# Altium footprint library capacitor_thd.PcbLib: 131 footprints (part 3 of 9)
Each footprint in its own frame and in the unit in brackets; x right, y up, seen from the top. Pads: shape width x height; smd on the part's side, far side on the other; paste and mask are expansions set on the pad; w line width, h text height; cw(c..) or ccw(c..) is an arc to the next point about the centre after c.
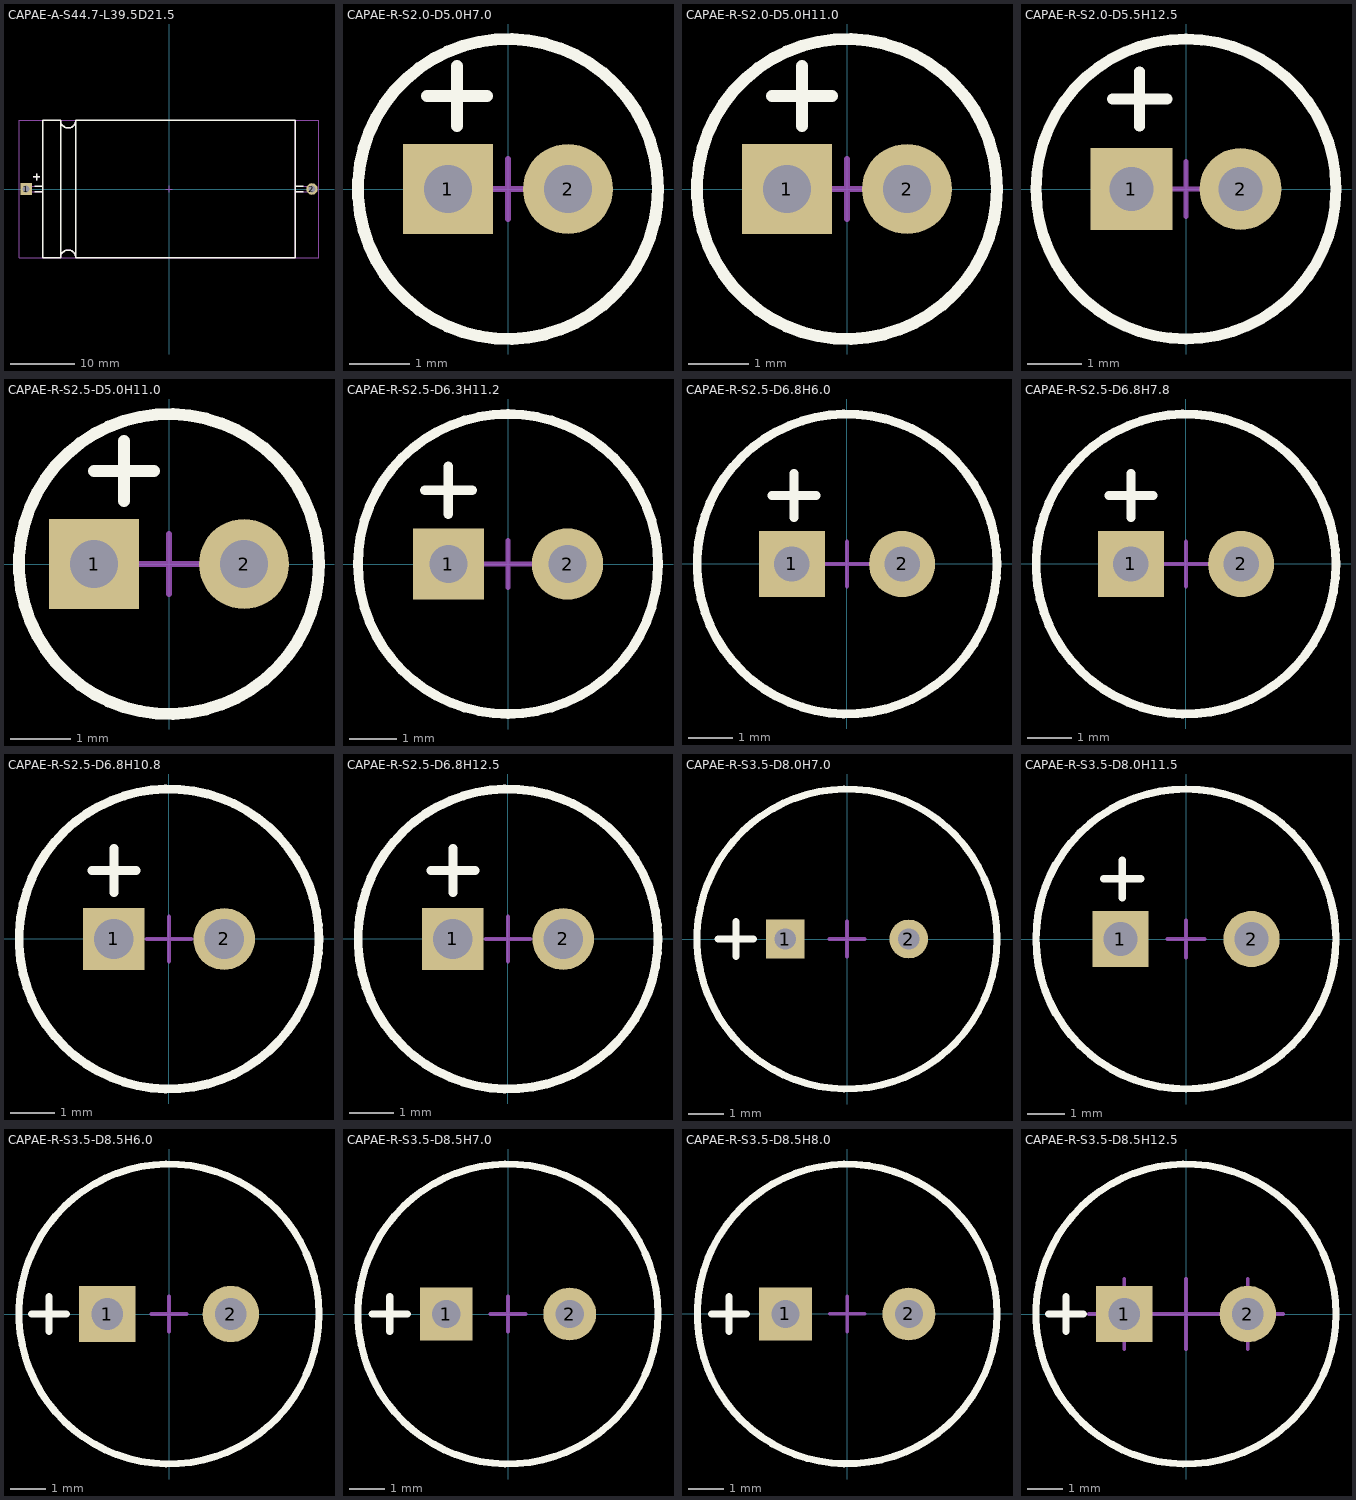
[diagram p2: the footprints below, top view; thin cyan lines are the x and y axes]

## CAPAE-A-S44.7-L39.5D21.5 [mm] "Capacitor Axial, Pin spacing 44.7mm - Body Length 39.5mm X Body Diameter 21.5mm"
height 21.5
pads (2):
  rect 1.8x1.8 hole 1.1: 1(-22.35,0)
  round 1.8 hole 1.1: 2(22.35,0)
Top Overlay:
  lines w0.2: -21.2,1.9 -20.2,1.9 ; -21.008,-0.4 -19.76,-0.4 ; -21.008,0.4 -19.76,0.4 ; -20.7,1.4 -20.7,2.4 ; 19.76,-0.4 21.008,-0.4 ; 19.76,0.4 21.008,0.4 ; -16.96,-10.75 cw(c-15.76,-10.75) -14.56,-10.75 ; -16.96,-10.75 -19.76,-10.75 -19.76,10.75 -16.96,10.75 ; -16.96,-10.75 -16.96,10.75 ; -16.96,10.75 ccw(c-15.76,10.75) -14.56,10.75 ; -14.56,-10.75 19.76,-10.75 19.76,10.75 -14.56,10.75 ; -14.56,-10.75 -14.56,10.75
Mechanical 1:
  lines w0.1: -21.2,1.9 -20.2,1.9 ; -20.7,1.4 -20.7,2.4 ; -19.76,-0.4 -22.35,-0.4 cw(c-22.35,0) -22.35,0.4 -19.76,0.4 ; -13.8,-10.75 19,-10.75 ; -13.8,10.75 19,10.75 ; 19.76,-10.75 19.76,10.75 ; 19.76,-0.4 22.35,-0.4 ccw(c22.35,0) 22.35,0.4 19.76,0.4 ; -16.96,-10.75 cw(c-15.76,-10.75) -14.56,-10.75 -14.56,10.75 cw(c-15.76,10.75) -16.96,10.75 ; -16.96,-10.75 -16.96,10.75 ; -16.96,-10.75 -19.76,-10.75 -19.76,10.75 -16.96,10.75
Mechanical 8:
  lines w0.05: -22.85,0 -22.35,0 ; -22.35,-0.5 -22.35,0 ; -22.35,0.5 -22.35,0 ; -21.85,0 -22.35,0 ; 21.85,0 22.35,0 ; 22.35,-0.5 22.35,0 ; 22.35,0.5 22.35,0 ; 22.85,0 22.35,0
Mechanical 15:
  lines w0.05: -0.5,0 0,0 ; 0,-0.5 0,0 ; 0,0.5 0,0 ; 0.5,0 0,0
  lines w0.1: -23.45,-10.75 -23.45,10.75 23.45,10.75 23.45,-10.75 -23.45,-10.75
3D body "CAPPA4470-3950X2150.stp": height 21.5, standoff -3.8, extent -22.747,-10.75 22.747,10.75

## CAPAE-R-S2.0-D5.0H7.0 [mm] "Capacitor, Radial, Pin spacing 2.0mm - Body Diameter 5.0mm X Body Height 7mm"
height 7
pads (2):
  rect 1.5x1.5 hole 0.8: 1(-1,0)
  round 1.5 hole 0.8: 2(1,0)
Top Overlay:
  circle w0.2: c0,0 r2.5
  lines w0.2: -1.35,1.55 -0.35,1.55 ; -0.85,1.05 -0.85,2.05
Mechanical 1:
  circle w0.1: c0,0 r2.5
  lines w0.1: -1.35,1.55 -0.35,1.55 ; -0.85,1.05 -0.85,2.05
Mechanical 15:
  circle w0.1: c0,0 r2.5
  lines w0.1: -0.5,0 0.5,0 ; 0,-0.5 0,0.5
3D body "CAPPR200-500X700.stp": height 7, standoff -3.6, extent -2.512,-2.512 2.488,2.488

## CAPAE-R-S2.0-D5.0H11.0 [mm] "Capacitor, Radial, Pin spacing 2.0mm - Body Diameter 5.0mm X Body Height 11mm"
height 11
pads (2):
  rect 1.5x1.5 hole 0.8: 1(-1,0)
  round 1.5 hole 0.8: 2(1,0)
Top Overlay:
  circle w0.2: c0,0 r2.5
  lines w0.2: -1.25,1.55 -0.25,1.55 ; -0.75,1.05 -0.75,2.05
Mechanical 1:
  circle w0.1: c0,0 r2.5
  lines w0.1: -1.25,1.55 -0.25,1.55 ; -0.75,1.05 -0.75,2.05
Mechanical 15:
  circle w0.1: c0,0 r2.5
  lines w0.1: -0.5,0 0.5,0 ; 0,-0.5 0,0.5
3D body "CAPPR200-500X1100.stp": height 10.9, standoff -3.6, extent -2.512,-2.512 2.488,2.488

## CAPAE-R-S2.0-D5.5H12.5 [mm] "Capacitor, Radial, Pin spacing 2.0mm - Body Diameter 5.5mm X Body Height 12.5mm"
height 12.5
pads (2):
  rect 1.5x1.5 hole 0.8: 1(-1,0)
  round 1.5 hole 0.8: 2(1,0)
Top Overlay:
  circle w0.2: c0,0 r2.75
  lines w0.2: -1.35,1.65 -0.35,1.65 ; -0.85,1.15 -0.85,2.15
Mechanical 1:
  circle w0.1: c0,0 r2.75
  lines w0.1: -1.35,1.65 -0.35,1.65 ; -0.85,1.15 -0.85,2.15
Mechanical 15:
  circle w0.1: c0,0 r2.75
  lines w0.1: -0.5,0 0.5,0 ; 0,-0.5 0,0.5
3D body "CAPPR200-550X1250.stp": height 12.5, standoff -3.6, extent -2.75,-2.75 2.75,2.75

## CAPAE-R-S2.5-D5.0H11.0 [mm] "Capacitor, Radial, Pin spacing 2.5mm - Body Diameter 5.0mm X Body Height 11mm"
height 11
pads (2):
  rect 1.5x1.5 hole 0.8: 1(-1.25,0)
  round 1.5 hole 0.8: 2(1.25,0)
Top Overlay:
  circle w0.2: c0,0 r2.5
  lines w0.2: -1.25,1.55 -0.25,1.55 ; -0.75,1.05 -0.75,2.05
Mechanical 1:
  circle w0.1: c0,0 r2.5
  lines w0.1: -1.25,1.55 -0.25,1.55 ; -0.75,1.05 -0.75,2.05
Mechanical 15:
  circle w0.1: c0,0 r2.5
  lines w0.1: -0.5,0 0.5,0 ; 0,-0.5 0,0.5
3D body "CAPPR250-500X1100.stp": height 10.9, standoff -3.6, extent -2.512,-2.512 2.488,2.488

## CAPAE-R-S2.5-D6.3H11.2 [mm] "Capacitor, Radial, Pin spacing 2.5mm - Body Diameter 6.3mm X Body Height 11.2mm"
height 11.2
pads (2):
  rect 1.5x1.5 hole 0.8: 1(-1.25,0)
  round 1.5 hole 0.8: 2(1.25,0)
Top Overlay:
  circle w0.2: c0,0 r3.15
  lines w0.2: -1.75,1.55 -0.75,1.55 ; -1.25,1.05 -1.25,2.05
Mechanical 1:
  circle w0.1: c0,0 r3.15
  lines w0.1: -1.75,1.55 -0.75,1.55 ; -1.25,1.05 -1.25,2.05
Mechanical 15:
  circle w0.1: c0,0 r3.15
  lines w0.1: -0.5,0 0.5,0 ; 0,-0.5 0,0.5
3D body "CAPPR250-630X1120.stp": height 11.2, standoff -3.6, extent -3.159,-3.159 3.141,3.107

## CAPAE-R-S2.5-D6.8H6.0 [mm] "Capacitor, Radial, Pin spacing 2.5mm - Body Diameter 6.8mm X Body Height 6.0mm"
height 6
pads (2):
  rect 1.5x1.5 hole 0.8: 1(-1.25,0)
  round 1.5 hole 0.8: 2(1.25,0)
Top Overlay:
  circle w0.2: c0,0 r3.4
  lines w0.2: -1.7,1.55 -0.7,1.55 ; -1.2,1.05 -1.2,2.05
Mechanical 1:
  circle w0.1: c0,0 r3.4
  lines w0.1: -1.7,1.55 -0.7,1.55 ; -1.2,1.05 -1.2,2.05
Mechanical 15:
  circle w0.1: c0,0 r3.4
  lines w0.1: -0.5,0 0.5,0 ; 0,-0.5 0,0.5
3D body "CAPPR250-680X600.stp": height 6, standoff -3.6, extent -3.41,-3.41 3.39,3.39

## CAPAE-R-S2.5-D6.8H7.8 [mm] "Capacitor, Radial, Pin spacing 2.5mm - Body Diameter 6.8mm X Body Height 7.8mm"
height 7.8
pads (2):
  rect 1.5x1.5 hole 0.8: 1(-1.25,0)
  round 1.5 hole 0.8: 2(1.25,0)
Top Overlay:
  circle w0.2: c0,0 r3.4
  lines w0.2: -1.75,1.55 -0.75,1.55 ; -1.25,1.05 -1.25,2.05
Mechanical 1:
  circle w0.1: c0,0 r3.4
  lines w0.1: -1.75,1.55 -0.75,1.55 ; -1.25,1.05 -1.25,2.05
Mechanical 15:
  circle w0.1: c0,0 r3.4
  lines w0.1: -0.5,0 0.5,0 ; 0,-0.5 0,0.5
3D body "CAPPR250-680X780.stp": height 7.8, standoff -3.6, extent -3.41,-3.41 3.39,3.39

## CAPAE-R-S2.5-D6.8H10.8 [mm] "Capacitor, Radial, Pin spacing 2.5mm - Body Diameter 6.8mm X Body Height 10.8mm"
height 10.8
pads (2):
  rect 1.4x1.4 hole 0.9: 1(-1.25,0)
  round 1.4 hole 0.9: 2(1.25,0)
Top Overlay:
  circle w0.2: c0,0 r3.4
  lines w0.2: -1.75,1.55 -0.75,1.55 ; -1.25,1.05 -1.25,2.05
Mechanical 1:
  circle w0.1: c0,0 r3.4
  lines w0.1: -1.75,1.55 -0.75,1.55 ; -1.25,1.05 -1.25,2.05
Mechanical 15:
  circle w0.1: c0,0 r3.4
  lines w0.1: -0.5,0 0.5,0 ; 0,-0.5 0,0.5
3D body "CAPPR250-680X1080.stp": height 10.8, standoff -3.6, extent -3.41,-3.41 3.39,3.39

## CAPAE-R-S2.5-D6.8H12.5 [mm] "Capacitor, Radial, Pin spacing 2.5mm - Body Diameter 6.8mm X Body Height 12.5mm"
height 12.5
pads (2):
  rect 1.4x1.4 hole 0.9: 1(-1.25,0)
  round 1.4 hole 0.9: 2(1.25,0)
Top Overlay:
  circle w0.2: c0,0 r3.4
  lines w0.2: -1.75,1.55 -0.75,1.55 ; -1.25,1.05 -1.25,2.05
Mechanical 1:
  circle w0.1: c0,0 r3.4
  lines w0.1: -1.75,1.55 -0.75,1.55 ; -1.25,1.05 -1.25,2.05
Mechanical 15:
  circle w0.1: c0,0 r3.4
  lines w0.1: -0.5,0 0.5,0 ; 0,-0.5 0,0.5
3D body "CAPPR250-680X1250.stp": height 12.5, standoff -3.6, extent -3.41,-3.408 3.39,3.388

## CAPAE-R-S3.5-D8.0H7.0 [mm] "Capacitor, Radial, Pin spacing 3.5mm - Body Diameter 8mm X Body Height 7mm"
height 7
pads (2):
  rect 1.1x1.1 hole 0.6: 1(-1.75,0)
  round 1.1 hole 0.6: 2(1.75,0)
Top Overlay:
  circle w0.2: c0,0 r4.25
  lines w0.2: -3.65,0 -2.65,0 ; -3.15,-0.5 -3.15,0.5
Mechanical 1:
  circle w0.1: c0,0 r4.25
  lines w0.1: -3.65,0 -2.65,0 ; -3.15,-0.5 -3.15,0.5
Mechanical 15:
  circle w0.1: c0,0 r4.25
  lines w0.1: -0.5,0 0.5,0 ; 0,-0.5 0,0.5
3D body "CAPPR350-800X700.stp": height 7, standoff -3.6, extent -4.259,-4.259 4.241,4.233

## CAPAE-R-S3.5-D8.0H11.5 [mm] "Capacitor, Radial, Pin spacing 3.5mm - Body Diameter 8.0mm X Body Height 11.5mm"
height 11.5
pads (2):
  rect 1.5x1.5 hole 0.9: 1(-1.75,0)
  round 1.5 hole 0.9: 2(1.75,0)
Top Overlay:
  circle w0.2: c0,0 r4
  lines w0.2: -2.2,1.6 -1.2,1.6 ; -1.7,1.1 -1.7,2.1
Mechanical 1:
  circle w0.1: c0,0 r4
  lines w0.1: -2.2,1.6 -1.2,1.6 ; -1.7,1.1 -1.7,2.1
Mechanical 15:
  circle w0.1: c0,0 r4
  lines w0.1: -0.5,0 0.5,0 ; 0,-0.5 0,0.5
3D body "CAPPR350-800X1150.stp": height 11.5, standoff -3.6, extent -4.012,-4.012 3.988,3.954

## CAPAE-R-S3.5-D8.5H6.0 [mm] "Capacitor, Radial, Pin spacing 3.5mm - Body Diameter 8.5mm X Body Height 6.0mm"
height 6
pads (2):
  rect 1.6x1.6 hole 0.9: 1(-1.75,0)
  round 1.6 hole 0.9: 2(1.75,0)
Top Overlay:
  circle w0.2: c0,0 r4.25
  lines w0.2: -3.9,0 -2.9,0 ; -3.4,-0.5 -3.4,0.5
Mechanical 1:
  circle w0.1: c0,0 r4.25
  lines w0.1: -3.9,0 -2.9,0 ; -3.4,-0.5 -3.4,0.5
Mechanical 15:
  circle w0.1: c0,0 r4.25
  lines w0.1: -0.5,0 0.5,0 ; 0,-0.5 0,0.5
3D body "CAPPR350-850X600.stp": height 6, standoff -3.6, extent -4.259,-4.259 4.241,4.241

## CAPAE-R-S3.5-D8.5H7.0 [mm] "Capacitor, Radial, Pin spacing 3.5mm - Body Diameter 8.5mm x Body Height 7.0mm"
height 7
pads (2):
  rect 1.5x1.5 hole 0.8: 1(-1.75,0)
  round 1.5 hole 0.8: 2(1.75,0)
Top Overlay:
  circle w0.2: c0,0 r4.25
  lines w0.2: -3.85,0 -2.85,0 ; -3.35,-0.5 -3.35,0.5
Mechanical 1:
  circle w0.1: c0,0 r4.25
  lines w0.1: -3.85,0 -2.85,0 ; -3.35,-0.5 -3.35,0.5
Mechanical 8:
  circle w0.1: c1.75,0 r0.225
  circle w0.1: c-1.75,0 r0.225
  lines w0.1: -1.975,0 -1.75,0 -1.75,-0.225 ; 1.525,0 1.75,0 1.75,-0.225
Mechanical 15:
  circle w0.1: c0,0 r4.25
  lines w0.1: -0.5,0 0.5,0 ; 0,-0.5 0,0.5
3D body "CAPPR350-850X700.stp": height 7, standoff -3.6, extent -4.25,-4.25 4.25,4.242

## CAPAE-R-S3.5-D8.5H8.0 [mm] "Capacitor, Radial, Pin spacing 3.5mm - Body Diameter 8.5mm x Body Height 8.0mm"
height 8
pads (2):
  rect 1.5x1.5 hole 0.8: 1(-1.75,0)
  round 1.5 hole 0.8: 2(1.75,0)
Top Overlay:
  circle w0.2: c0,0 r4.25
  lines w0.2: -3.85,0 -2.85,0 ; -3.35,-0.5 -3.35,0.5
Mechanical 1:
  circle w0.1: c0,0 r4.25
  lines w0.1: -3.85,0 -2.85,0 ; -3.35,-0.5 -3.35,0.5
Mechanical 8:
  circle w0.1: c-1.75,0 r0.225
  circle w0.1: c1.75,0 r0.225
  lines w0.1: -1.975,0 -1.75,0 -1.75,-0.225 ; 1.525,0 1.75,0 1.75,-0.225
Mechanical 15:
  circle w0.1: c-0.01,-0.002 r4.25
  lines w0.1: -0.5,0 0.5,0 ; 0,-0.5 0,0.5
3D body "CAPPR350-850X800.stp": height 8, standoff -3.6, extent -4.25,-4.25 4.25,4.25

## CAPAE-R-S3.5-D8.5H12.5 [mm] "Capacitor, Radial, Pin spacing 3.5mm - Body Diameter 8.5mm x Body Height 12.5mm"
height 12.5
pads (2):
  rect 1.6x1.6 hole 0.9: 1(-1.75,0)
  round 1.6 hole 0.9: 2(1.75,0)
Top Overlay:
  circle w0.2: c0,0 r4.25
  lines w0.2: -3.9,0 -2.9,0 ; -3.4,-0.5 -3.4,0.5
Mechanical 1:
  circle w0.1: c0,0 r4.25
  lines w0.1: -3.9,0 -2.9,0 ; -3.4,-0.5 -3.4,0.5
Mechanical 8:
  circle w0.1: c-1.75,0 r0.225
  circle w0.1: c1.75,0 r0.225
  lines w0.1: -2.75,0 -1.75,0 ; -1.975,0 -1.75,0 ; -1.75,-1 -1.75,0 ; -1.75,-0.225 -1.75,0 ; -1.75,1 -1.75,0 ; -1,0 0,0 ; -0.75,0 -1.75,0 ; 0,-1 0,0 ; 0,1 0,0 ; 0.75,0 1.75,0 ; 1,0 0,0 ; 1.525,0 1.75,0 ; 1.75,-1 1.75,0 ; 1.75,-0.225 1.75,0 ; 1.75,1 1.75,0 ; 2.75,0 1.75,0
Mechanical 15:
  circle w0.1: c0,0 r4.25
  lines w0.1: -0.5,0 0.5,0 ; 0,-0.5 0,0.5
3D body "CAPPR350-850X1250.stp": height 12.5, standoff -3.6, extent -4.25,-4.246 4.25,4.246